# Altium footprint library Reflow3D1411sep.PcbLib: 657 footprints (part 20 of 42)
Each footprint in its own frame and in the unit in brackets; x right, y up, seen from the top. Pads: shape width x height; smd on the part's side, far side on the other; paste and mask are expansions set on the pad; w line width, h text height; cw(c..) or ccw(c..) is an arc to the next point about the centre after c.
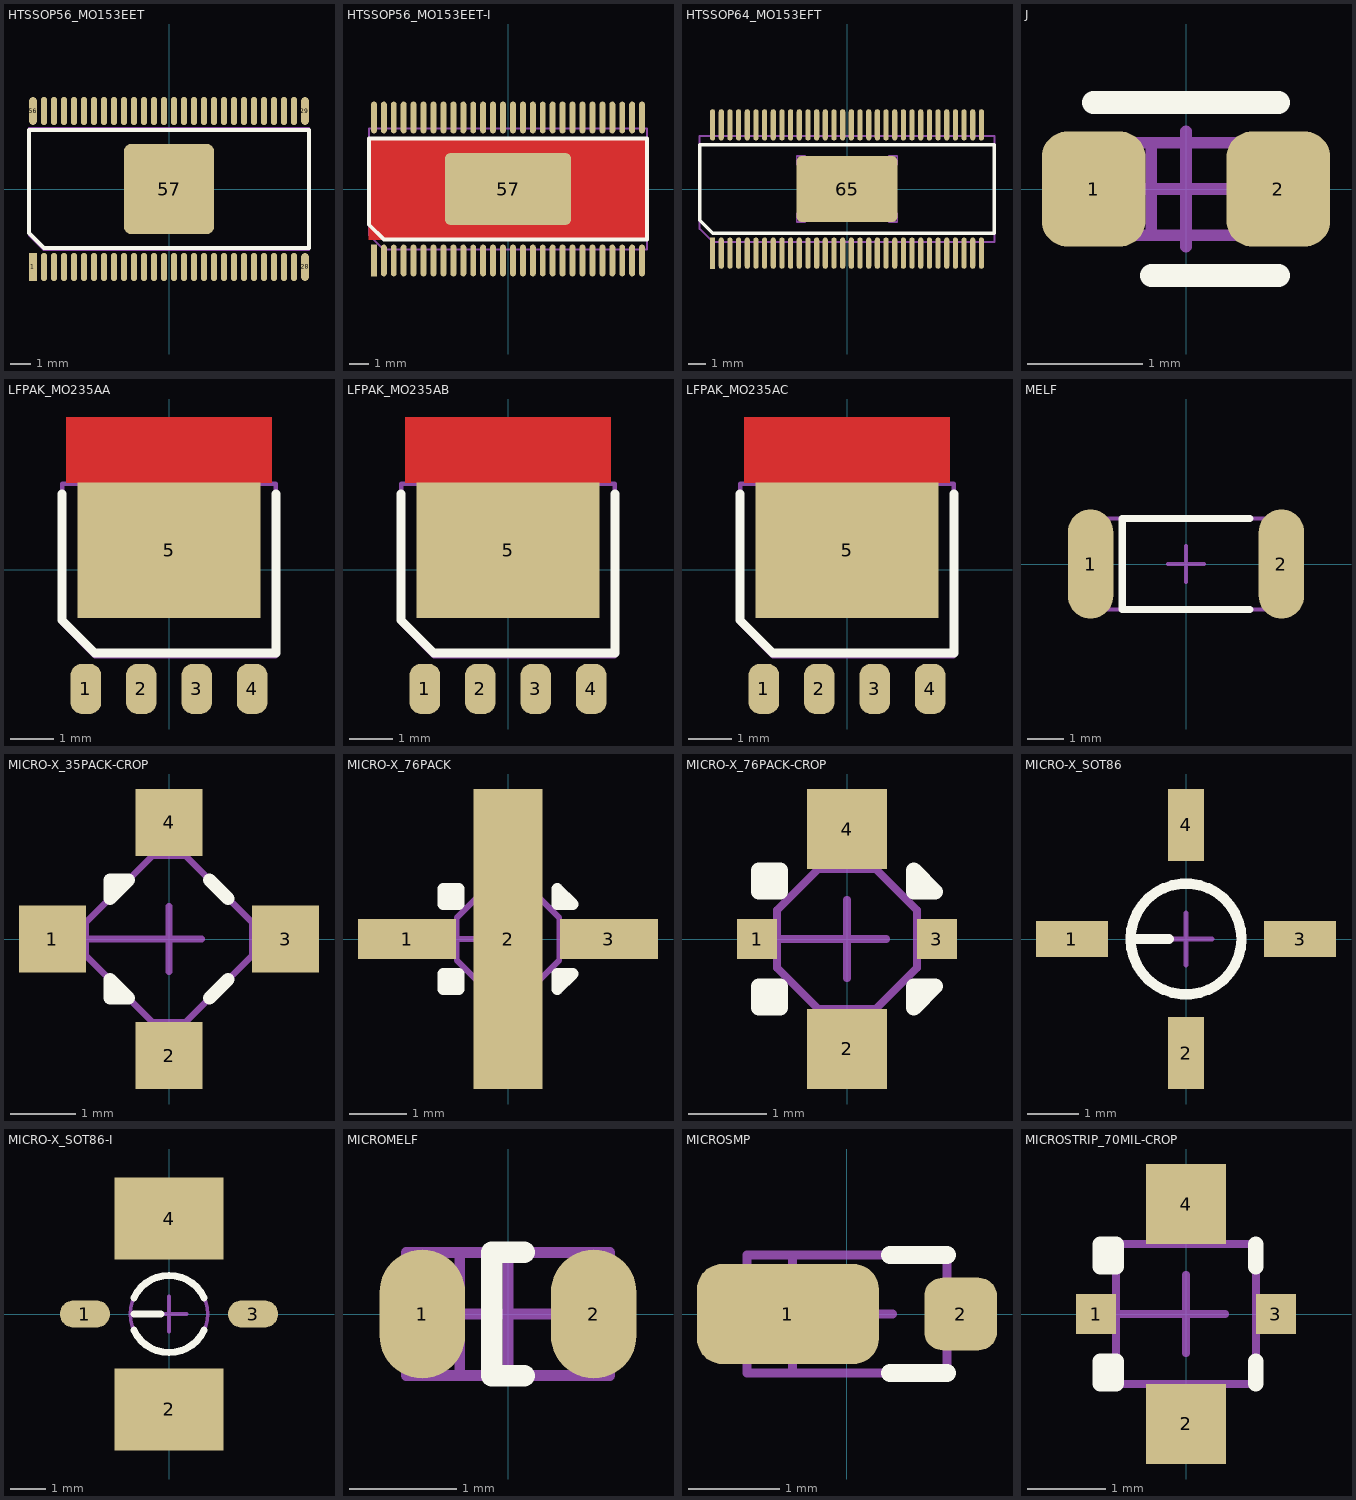
[diagram p19: the footprints below, top view; thin cyan lines are the x and y axes]

## HTSSOP56_MO153EET [mm] "www.nxp.com, sot793-1_po.pdf, SOT793-1_fr.pdf"
height 1.03
pads (57):
  rect 0.4x1.4 smd mask+0.05: 1(-6.8,-3.9)
  oval 0.3x1.4 smd mask+0.05: 2(-6.25,-3.9) 3(-5.75,-3.9) 4(-5.25,-3.9) 5(-4.75,-3.9) 6(-4.25,-3.9) 7(-3.75,-3.9) 8(-3.25,-3.9) 9(-2.75,-3.9) 10(-2.25,-3.9) 11(-1.75,-3.9) 12(-1.25,-3.9) 13(-0.75,-3.9) 14(-0.25,-3.9) 15(0.25,-3.9) 16(0.75,-3.9) 17(1.25,-3.9) 18(1.75,-3.9) 19(2.25,-3.9) 20(2.75,-3.9) 21(3.25,-3.9) 22(3.75,-3.9) 23(4.25,-3.9) 24(4.75,-3.9) 25(5.25,-3.9) 26(5.75,-3.9) 27(6.25,-3.9) 30(6.25,3.9) 31(5.75,3.9) 32(5.25,3.9) 33(4.75,3.9) 34(4.25,3.9) 35(3.75,3.9) 36(3.25,3.9) 37(2.75,3.9) 38(2.25,3.9) 39(1.75,3.9) 40(1.25,3.9) 41(0.75,3.9) 42(0.25,3.9) 43(-0.25,3.9) 44(-0.75,3.9) 45(-1.25,3.9) 46(-1.75,3.9) 47(-2.25,3.9) 48(-2.75,3.9) 49(-3.25,3.9) 50(-3.75,3.9) 51(-4.25,3.9) 52(-4.75,3.9) 53(-5.25,3.9) 54(-5.75,3.9) 55(-6.25,3.9)
  oval 0.4x1.4 smd mask+0.05: 28(6.8,-3.9) 29(6.8,3.9) 56(-6.8,3.9)
  rrect15% 4.5x4.5 smd paste-25.4 mask+0.075: 57(0,0)
Top Overlay:
  lines w0.2: -7,-2.2 -6.25,-2.95 7,-2.95 7,2.95 -7,2.95 -7,-2.2
Top Paste:
  region: 0.5,-0.5 0.5,0.5 -0.5,0.5 -0.5,-0.5
  region: 2.2,-0.5 2.2,0.5 1.2,0.5 1.2,-0.5
  region: 0.5,2.2 -0.5,2.2 -0.5,1.2 0.5,1.2
  region: -2.2,0.5 -2.2,-0.5 -1.2,-0.5 -1.2,0.5
  region: -0.5,-2.2 0.5,-2.2 0.5,-1.2 -0.5,-1.2
  region: 2.2,1.2 2.2,2.2 1.2,2.2 1.2,1.2
  region: 2.2,-2.2 2.2,-1.2 1.2,-1.2 1.2,-2.2
  region: -1.2,2.2 -2.2,2.2 -2.2,1.2 -1.2,1.2
  region: -2.2,-2.2 -1.2,-2.2 -1.2,-1.2 -2.2,-1.2
Mechanical 13:
  lines w0.1: -2.1,-1.6 -2.1,-2.1 -1.6,-2.1 ; -2.1,1.6 -2.1,2.1 -1.6,2.1 ; 1.6,-2.1 2.1,-2.1 2.1,-1.6 ; 1.6,2.1 2.1,2.1 2.1,1.6 ; -7,-2.3 -6.25,-3.05 7,-3.05 7,3.05 -7,3.05 -7,-2.3
Mechanical 15:
  lines w0.1: -0.5,0 0.5,0 ; 0,-0.5 0,0.5
3D body: height 1.2, standoff 0, extent -7.05,-3.1 7.05,3.1

## HTSSOP56_MO153EET-I [mm] "www.ti.com, tas5182.pdf"
height 1.1
pads (57):
  rect 0.3x1.6 smd mask+0.05: 1(-6.75,-3.6)
  oval 0.3x1.6 smd mask+0.05: 2(-6.25,-3.6) 3(-5.75,-3.6) 4(-5.25,-3.6) 5(-4.75,-3.6) 6(-4.25,-3.6) 7(-3.75,-3.6) 8(-3.25,-3.6) 9(-2.75,-3.6) 10(-2.25,-3.6) 11(-1.75,-3.6) 12(-1.25,-3.6) 13(-0.75,-3.6) 14(-0.25,-3.6) 15(0.25,-3.6) 16(0.75,-3.6) 17(1.25,-3.6) 18(1.75,-3.6) 19(2.25,-3.6) 20(2.75,-3.6) 21(3.25,-3.6) 22(3.75,-3.6) 23(4.25,-3.6) 24(4.75,-3.6) 25(5.25,-3.6) 26(5.75,-3.6) 27(6.25,-3.6) 28(6.75,-3.6) 29(6.75,3.6) 30(6.25,3.6) 31(5.75,3.6) 32(5.25,3.6) 33(4.75,3.6) 34(4.25,3.6) 35(3.75,3.6) 36(3.25,3.6) 37(2.75,3.6) 38(2.25,3.6) 39(1.75,3.6) 40(1.25,3.6) 41(0.75,3.6) 42(0.25,3.6) 43(-0.25,3.6) 44(-0.75,3.6) 45(-1.25,3.6) 46(-1.75,3.6) 47(-2.25,3.6) 48(-2.75,3.6) 49(-3.25,3.6) 50(-3.75,3.6) 51(-4.25,3.6) 52(-4.75,3.6) 53(-5.25,3.6) 54(-5.75,3.6) 55(-6.25,3.6) 56(-6.75,3.6)
  rrect15% 6.35x3.61 smd mask+0: 57(0,0)
Top Layer:
  region: -7,2.55 7,2.55 7,-2.55 -7,-2.55
Top Overlay:
  lines w0.2: -7,-1.8 -6.25,-2.55 7,-2.55 7,2.55 -7,2.55 -7,-1.8
Mechanical 13:
  lines w0.1: -2.8,-1.08 -2.8,-1.58 -2.3,-1.58 ; -2.8,1.08 -2.8,1.58 -2.3,1.58 ; 2.3,-1.58 2.8,-1.58 2.8,-1.08 ; 2.3,1.58 2.8,1.58 2.8,1.08 ; -7,-2.3 -6.25,-3.05 7,-3.05 7,3.05 -7,3.05 -7,-2.3
Mechanical 15:
  lines w0.1: -0.5,0 0.5,0 ; 0,-0.5 0,0.5
3D body: height 1.2, standoff 0, extent -7.05,-3.1 7.05,3.1

## HTSSOP64_MO153EFT [mm] "www.national.com, mxd64a.pdf"
height 1
pads (65):
  rect 0.3x1.8 smd mask+0.05: 1(-7.75,-3.7)
  oval 0.3x1.8 smd mask+0.05: 2(-7.25,-3.7) 3(-6.75,-3.7) 4(-6.25,-3.7) 5(-5.75,-3.7) 6(-5.25,-3.7) 7(-4.75,-3.7) 8(-4.25,-3.7) 9(-3.75,-3.7) 10(-3.25,-3.7) 11(-2.75,-3.7) 12(-2.25,-3.7) 13(-1.75,-3.7) 14(-1.25,-3.7) 15(-0.75,-3.7) 16(-0.25,-3.7) 17(0.25,-3.7) 18(0.75,-3.7) 19(1.25,-3.7) 20(1.75,-3.7) 21(2.25,-3.7) 22(2.75,-3.7) 23(3.25,-3.7) 24(3.75,-3.7) 25(4.25,-3.7) 26(4.75,-3.7) 27(5.25,-3.7) 28(5.75,-3.7) 29(6.25,-3.7) 30(6.75,-3.7) 31(7.25,-3.7) 32(7.75,-3.7) 33(7.75,3.7) 34(7.25,3.7) 35(6.75,3.7) 36(6.25,3.7) 37(5.75,3.7) 38(5.25,3.7) 39(4.75,3.7) 40(4.25,3.7) 41(3.75,3.7) 42(3.25,3.7) 43(2.75,3.7) 44(2.25,3.7) 45(1.75,3.7) 46(1.25,3.7) 47(0.75,3.7) 48(0.25,3.7) 49(-0.25,3.7) 50(-0.75,3.7) 51(-1.25,3.7) 52(-1.75,3.7) 53(-2.25,3.7) 54(-2.75,3.7) 55(-3.25,3.7) 56(-3.75,3.7) 57(-4.25,3.7) 58(-4.75,3.7) 59(-5.25,3.7) 60(-5.75,3.7) 61(-6.25,3.7) 62(-6.75,3.7) 63(-7.25,3.7) 64(-7.75,3.7)
  rrect15% 5.81x3.81 smd mask+0.075: 65(0,0)
Top Overlay:
  lines w0.2: -8.5,-1.8 -8.5,2.55 8.5,2.55 8.5,-2.55 -7.75,-2.55 -8.5,-1.8
Mechanical 13:
  lines w0.1: -2.905,-1.405 -2.905,-1.905 -2.405,-1.905 ; -2.905,1.405 -2.905,1.905 -2.405,1.905 ; 2.405,-1.905 2.905,-1.905 2.905,-1.405 ; 2.405,1.905 2.905,1.905 2.905,1.405 ; -8.5,-2.3 -8.5,3.05 8.5,3.05 8.5,-3.05 -7.75,-3.05 -8.5,-2.3
Mechanical 15:
  lines w0.1: -0.5,0 0.5,0 ; 0,-0.5 0,0.5
3D body: height 1.1, standoff 0, extent -8.55,-3.1 8.55,3.1

## J [mm] "www.nec-tokin.com, capacitors.pdf"
height 0.8
pads (2):
  rrect50% 0.9x1 smd mask+0.075: 1(-0.8,0) 2(0.8,0)
Top Overlay:
  lines w0.2: -0.8,0.75 0.8,0.75 ; -0.3,-0.75 0.8,-0.75
Mechanical 13:
  lines w0.1: -0.3,-0.4 -0.3,0.4 ; -0.8,-0.4 0.8,-0.4 0.8,0.4 -0.8,0.4 -0.8,-0.4
Mechanical 15:
  lines w0.1: -0.5,0 0.5,0 ; 0,-0.5 0,0.5
3D body: height 0.9, standoff 0, extent -0.85,-0.45 0.85,0.45

## LFPAK_MO235AA [mm] "www.nxp.com, sot669_po.pdf, sot669_fr.pdf; www.jedec.org, MO-235B.pdf"
height 1.05
pads (5):
  rrect75% 0.7x1.15 smd mask+0.075: 1(-1.905,-2.725) 2(-0.635,-2.725) 3(0.635,-2.725) 4(1.905,-2.725)
  rect 4.2x3.1 smd paste-25.4 mask-25.4: 5(0,0.45)
Top Layer:
  region: -2.35,2 2.35,2 2.35,3.5 -2.35,3.5
Top Overlay:
  lines w0.2: -2.45,1.75 -2.45,-1.15 -1.7,-1.9 2.45,-1.9 2.45,1.75
Top Paste:
  region: 0.925,3.45 0.325,3.45 0.325,2.55 0.925,2.55
  region: -0.325,3.45 -0.925,3.45 -0.925,2.55 -0.325,2.55
  region: 1.575,2.55 2.175,2.55 2.175,3.45 1.575,3.45
  region: -1.575,3.45 -2.175,3.45 -2.175,2.55 -1.575,2.55
  region: 0.45,-0.85 0.45,-0.25 -0.45,-0.25 -0.45,-0.85
  region: 1.6,-0.85 1.6,-0.25 0.7,-0.25 0.7,-0.85
  region: -0.7,-0.85 -0.7,-0.25 -1.6,-0.25 -1.6,-0.85
  region: -0.45,1.45 -0.45,0.85 0.45,0.85 0.45,1.45
  region: -1.6,1.45 -1.6,0.85 -0.7,0.85 -0.7,1.45
  region: 0.7,1.45 0.7,0.85 1.6,0.85 1.6,1.45
  region: 0.7,0.6 0.7,0 1.6,0 1.6,0.6
  region: -1.6,0.6 -1.6,0 -0.7,0 -0.7,0.6
  region: -0.45,0.6 -0.45,0 0.45,0 0.45,0.6
Top Solder:
  region: 2.175,-1.175 2.175,1.925 2.425,1.925 2.425,3.575 -2.425,3.575 -2.425,1.925 -2.175,1.925 -2.175,-1.175
Mechanical 13:
  lines w0.1: -2.45,-1.225 -2.45,1.975 2.45,1.975 2.45,-1.975 -1.7,-1.975 -2.45,-1.225
Mechanical 15:
  lines w0.1: -0.5,0 0.5,0 ; 0,-0.5 0,0.5
3D body: height 1.2, standoff 0, extent -2.5,-2.05 2.5,2.05

## LFPAK_MO235AB [mm] "www.nxp.com, sot669_fr.pdf; www.jedec.org, MO-235B.pdf"
height 0.9
pads (5):
  rrect75% 0.7x1.15 smd mask+0.075: 1(-1.905,-2.725) 2(-0.635,-2.725) 3(0.635,-2.725) 4(1.905,-2.725)
  rect 4.2x3.1 smd paste-25.4 mask-25.4: 5(0,0.45)
Top Layer:
  region: -2.35,2 2.35,2 2.35,3.5 -2.35,3.5
Top Overlay:
  lines w0.2: -2.45,1.75 -2.45,-1.15 -1.7,-1.9 2.45,-1.9 2.45,1.75
Top Paste:
  region: 0.925,3.45 0.325,3.45 0.325,2.55 0.925,2.55
  region: -0.325,3.45 -0.925,3.45 -0.925,2.55 -0.325,2.55
  region: 1.575,2.55 2.175,2.55 2.175,3.45 1.575,3.45
  region: -1.575,3.45 -2.175,3.45 -2.175,2.55 -1.575,2.55
  region: 0.45,-0.85 0.45,-0.25 -0.45,-0.25 -0.45,-0.85
  region: 1.6,-0.85 1.6,-0.25 0.7,-0.25 0.7,-0.85
  region: -0.7,-0.85 -0.7,-0.25 -1.6,-0.25 -1.6,-0.85
  region: -0.45,1.45 -0.45,0.85 0.45,0.85 0.45,1.45
  region: -1.6,1.45 -1.6,0.85 -0.7,0.85 -0.7,1.45
  region: 0.7,1.45 0.7,0.85 1.6,0.85 1.6,1.45
  region: 0.7,0.6 0.7,0 1.6,0 1.6,0.6
  region: -1.6,0.6 -1.6,0 -0.7,0 -0.7,0.6
  region: -0.45,0.6 -0.45,0 0.45,0 0.45,0.6
Top Solder:
  region: 2.175,-1.175 2.175,1.925 2.425,1.925 2.425,3.575 -2.425,3.575 -2.425,1.925 -2.175,1.925 -2.175,-1.175
Mechanical 13:
  lines w0.1: -2.45,-1.225 -2.45,1.975 2.45,1.975 2.45,-1.975 -1.7,-1.975 -2.45,-1.225
Mechanical 15:
  lines w0.1: -0.5,0 0.5,0 ; 0,-0.5 0,0.5
3D body: height 1, standoff 0, extent -2.5,-2.05 2.5,2.05

## LFPAK_MO235AC [mm] "www.nxp.com, sot669_fr.pdf; www.jedec.org, MO-235B.pdf"
height 0.7
pads (5):
  rrect75% 0.7x1.15 smd mask+0.075: 1(-1.905,-2.725) 2(-0.635,-2.725) 3(0.635,-2.725) 4(1.905,-2.725)
  rect 4.2x3.1 smd paste-25.4 mask-25.4: 5(0,0.45)
Top Layer:
  region: -2.35,2 2.35,2 2.35,3.5 -2.35,3.5
Top Overlay:
  lines w0.2: -2.45,1.75 -2.45,-1.15 -1.7,-1.9 2.45,-1.9 2.45,1.75
Top Paste:
  region: -0.45,0.6 -0.45,0 0.45,0 0.45,0.6
  region: -1.6,0.6 -1.6,0 -0.7,0 -0.7,0.6
  region: 0.7,0.6 0.7,0 1.6,0 1.6,0.6
  region: 0.7,1.45 0.7,0.85 1.6,0.85 1.6,1.45
  region: -1.6,1.45 -1.6,0.85 -0.7,0.85 -0.7,1.45
  region: -0.45,1.45 -0.45,0.85 0.45,0.85 0.45,1.45
  region: -0.7,-0.85 -0.7,-0.25 -1.6,-0.25 -1.6,-0.85
  region: 1.6,-0.85 1.6,-0.25 0.7,-0.25 0.7,-0.85
  region: 0.45,-0.85 0.45,-0.25 -0.45,-0.25 -0.45,-0.85
  region: -1.575,3.45 -2.175,3.45 -2.175,2.55 -1.575,2.55
  region: 1.575,2.55 2.175,2.55 2.175,3.45 1.575,3.45
  region: -0.325,3.45 -0.925,3.45 -0.925,2.55 -0.325,2.55
  region: 0.925,3.45 0.325,3.45 0.325,2.55 0.925,2.55
Top Solder:
  region: 2.175,-1.175 2.175,1.925 2.425,1.925 2.425,3.575 -2.425,3.575 -2.425,1.925 -2.175,1.925 -2.175,-1.175
Mechanical 13:
  lines w0.1: -2.45,-1.225 -2.45,1.975 2.45,1.975 2.45,-1.975 -1.7,-1.975 -2.45,-1.225
Mechanical 15:
  lines w0.1: -0.5,0 0.5,0 ; 0,-0.5 0,0.5
3D body: height 0.8, standoff 0, extent -2.5,-2.05 2.5,2.05

## MELF [mm] "www.vishay.com, zmy3v9.pdf"
height 2.5
pads (2):
  oval 1.25x3 smd mask+0.075: 1(-2.625,0) 2(2.625,0)
Top Overlay:
  lines w0.2: 1.75,-1.25 -1.75,-1.25 -1.75,1.25 1.75,1.25
Mechanical 13:
  lines w0.1: -1.75,-1.25 -1.75,1.25 ; -2.5,-1.25 -2.5,1.25 2.5,1.25 2.5,-1.25 -2.5,-1.25
Mechanical 15:
  lines w0.1: -0.5,0 0.5,0 ; 0,-0.5 0,0.5
3D body: height 2.6, standoff 0, extent -2.6,-1.3 2.6,1.3

## MICRO-X_35PACK-CROP [mm] "www.agilent.com, at41435.pdf, layout.pdf, AVNK35"
height 1.6
pads (4):
  rect 1.02x1.02 smd: 1(-1.78,0) 2(0,-1.78) 3(1.78,0) 4(0,1.78)
Top Overlay:
  lines w0.2: 0.62,-0.9 0.9,-0.62 ; 0.62,0.9 0.9,0.62 ; -0.9,-0.9 -0.9,-0.62 -0.62,-0.9 -0.9,-0.9 ; -0.9,0.62 -0.62,0.9 -0.9,0.9 -0.9,0.62
Mechanical 13:
  lines w0.1: -1.27,0 -0.52,0 ; -1.27,-0.25 -1.27,0.25 -0.25,1.27 0.25,1.27 1.27,0.25 1.27,-0.25 0.25,-1.27 -0.25,-1.27 -1.27,-0.25
Mechanical 15:
  lines w0.1: -0.5,0 0.5,0 ; 0,-0.5 0,0.5
3D body: height 1.9, standoff 0, extent -1.335,-1.335 1.335,1.335

## MICRO-X_76PACK [mm] "www.infineon.com, bfy420.pdf, hlg05536.gif; www.fcsi.fujitsu.com, 170-07563-0-FHC40LG.pdf"
height 1.05
pads (3):
  rect 1.7x0.7 smd mask+0: 1(-1.75,0) 3(1.75,0)
  rect 1.2x5.2 smd mask+0: 2(0,0)
Top Overlay:
  lines w0.2: -1.125,-0.6 -1.125,-0.875 -0.85,-0.875 ; -1.125,-0.6 -0.85,-0.6 -0.85,-0.875 ; -1.125,-0.6 -0.85,-0.875 ; -1.125,0.6 -1.125,0.875 -0.85,0.875 ; -1.125,0.6 -0.85,0.6 -0.85,0.875 ; -1.125,0.6 -0.85,0.875 ; 0.85,-0.875 1.125,-0.6 0.85,-0.6 0.85,-0.875 ; 0.85,0.6 1.125,0.6 0.85,0.875 0.85,0.6
Mechanical 13:
  lines w0.1: -0.89,0 -0.14,0 ; -0.89,-0.37 -0.37,-0.89 0.37,-0.89 0.89,-0.37 0.89,0.37 0.37,0.89 -0.37,0.89 -0.89,0.37 -0.89,-0.37
Mechanical 15:
  lines w0.1: -0.5,0 0.5,0 ; 0,-0.5 0,0.5
3D body: height 1.3, standoff 0, extent -0.965,-0.965 0.965,0.965

## MICRO-X_76PACK-CROP [mm] "www.infineon.com, bfy420.pdf; www.fcsi.fujitsu.com, 170-07563-0-FHC40LG.pdf; www.agilent.com, layout.pdf, LG"
height 1.05
pads (4):
  rect 0.51x0.51 smd: 1(-1.145,0) 3(1.145,0)
  rect 1.02x1.02 smd: 2(0,-1.4) 4(0,1.4)
Top Overlay:
  lines w0.2: -1.125,-0.6 -1.125,-0.875 -0.85,-0.875 ; -1.125,-0.6 -0.85,-0.6 -0.85,-0.875 ; -1.125,-0.6 -0.85,-0.875 ; -1.125,0.6 -1.125,0.875 -0.85,0.875 ; -1.125,0.6 -0.85,0.6 -0.85,0.875 ; -1.125,0.6 -0.85,0.875 ; 0.85,-0.875 1.125,-0.6 0.85,-0.6 0.85,-0.875 ; 0.85,0.6 1.125,0.6 0.85,0.875 0.85,0.6
Mechanical 13:
  lines w0.1: -0.89,0 -0.14,0 ; -0.89,-0.37 -0.37,-0.89 0.37,-0.89 0.89,-0.37 0.89,0.37 0.37,0.89 -0.37,0.89 -0.89,0.37 -0.89,-0.37
Mechanical 15:
  lines w0.1: -0.5,0 0.5,0 ; 0,-0.5 0,0.5
3D body: height 1.3, standoff 0, extent -0.965,-0.965 0.965,0.965

## MICRO-X_SOT86 [mm] "www.hittite.com, mp86_package_info.pdf"
height 1.62
pads (4):
  rect 1.4x0.7 smd mask+0: 1(-2.22,0) 3(2.22,0)
  rect 0.7x1.4 smd mask+0: 2(0,-2.22) 4(0,2.22)
Top Overlay:
  circle w0.2: c0,0 r1.08
  lines w0.2: -1.08,0 -0.33,0
Mechanical 13:
  circle w0.1: c0,0 r1.08
  lines w0.1: -1.08,0 -0.33,0
Mechanical 15:
  lines w0.1: -0.5,0 0.5,0 ; 0,-0.5 0,0.5
3D body: height 1.83, standoff 0, extent -1.136,-1.143 1.145,1.143

## MICRO-X_SOT86-I [mm] "www.rfmd.com, SGA-4386(Z)_Outline_Drawing.pdf"
height 1.65
pads (4):
  oval 1.4x0.76 smd paste-25.4 mask-25.4: 1(-2.35,0) 3(2.35,0)
  rect 3.05x2.29 smd paste-25.4 mask-25.4: 2(0,-2.67) 4(0,2.67)
Top Overlay:
  lines w0.2: -0.979,-0.456 ccw(c0,0) 0.979,-0.456 ; -0.979,0.456 cw(c0,0) 0.979,0.456 ; -0.975,0 -0.225,0
Top Paste:
  region: -0.32,2.73 -0.32,1.525 0.32,1.525 0.32,2.73
  region: -0.32,-1.525 -0.32,-2.73 0.32,-2.73 0.32,-1.525
  region: -1.65,0.32 -2.77,0.32 -2.77,-0.32 -1.65,-0.32
  region: 2.77,0.32 1.65,0.32 1.65,-0.32 2.77,-0.32
Top Solder:
  region: -0.32,-2.73 0.32,-2.73 0.32,-1.385 -0.32,-1.385
  region: -2.77,0.32 -2.77,-0.32 -1.16,-0.32 -1.16,0.32
  region: 0.32,2.73 -0.32,2.73 -0.32,1.385 0.32,1.385
  region: 2.77,-0.32 2.77,0.32 1.16,0.32 1.16,-0.32
Mechanical 13:
  circle w0.1: c0,0 r1.08
  lines w0.1: -1.08,0 -0.33,0
Mechanical 15:
  lines w0.1: -0.5,0 0.5,0 ; 0,-0.5 0,0.5
3D body: height 1.7, standoff 0, extent -1.136,-1.143 1.145,1.143

## MICROMELF [mm] "www.vishay.com, 85627.pdf"
height 1.15
pads (2):
  oval 0.8x1.2 smd mask+0.075: 1(-0.8,0) 2(0.8,0)
Top Overlay:
  lines w0.2: 0.15,-0.575 -0.15,-0.575 -0.15,0.575 0.15,0.575
Mechanical 13:
  lines w0.1: -0.45,-0.575 -0.45,0.575 ; -0.95,-0.575 -0.95,0.575 0.95,0.575 0.95,-0.575 -0.95,-0.575
Mechanical 15:
  lines w0.1: -0.5,0 0.5,0 ; 0,-0.5 0,0.5
3D body: height 1.2, standoff 0, extent -1,-0.6 1,0.6

## MICROSMP [mm] "www.vishay.com, mse1pj.pdf"
height 0.68
pads (2):
  rrect50% 2x1.1 smd mask+0.075: 1(-0.65,0)
  rrect50% 0.8x0.8 smd mask+0.075: 2(1.25,0)
Top Overlay:
  lines w0.2: 0.475,-0.65 1.1,-0.65 ; 0.475,0.65 1.1,0.65
Mechanical 13:
  lines w0.1: -0.6,-0.65 -0.6,0.65 ; -1.1,-0.65 -1.1,0.65 1.1,0.65 1.1,-0.65 -1.1,-0.65
Mechanical 15:
  lines w0.1: -0.5,0 0.5,0 ; 0,-0.5 0,0.5
3D body: height 0.73, standoff 0, extent -1.15,-0.7 1.15,0.7

## MICROSTRIP_70MIL-CROP [mm] "www.hp.woodshot.com, at42070.pdf; www.agilent.com, layout.pdf, AVNK70"
height 1
pads (4):
  rect 0.51x0.51 smd: 1(-1.145,0) 3(1.145,0)
  rect 1.02x1.02 smd: 2(0,-1.4) 4(0,1.4)
Top Overlay:
  lines w0.2: 0.89,-0.89 0.89,-0.6 ; 0.89,0.6 0.89,0.89 ; -1.09,-0.89 -1.09,-0.6 -0.89,-0.6 -0.89,-0.89 -1.09,-0.89 ; -1.09,0.6 -0.89,0.6 -0.89,0.89 -1.09,0.89 -1.09,0.6
Mechanical 13:
  lines w0.1: -0.89,0 -0.14,0 ; -0.89,-0.89 -0.89,0.89 0.89,0.89 0.89,-0.89 -0.89,-0.89
Mechanical 15:
  lines w0.1: -0.5,0 0.5,0 ; 0,-0.5 0,0.5
3D body: height 1.17, standoff 0, extent -0.955,-0.955 0.955,0.955